# Altium footprint library Reflow3D1411sep.PcbLib: 657 footprints (part 14 of 42)
Each footprint in its own frame and in the unit in brackets; x right, y up, seen from the top. Pads: shape width x height; smd on the part's side, far side on the other; paste and mask are expansions set on the pad; w line width, h text height; cw(c..) or ccw(c..) is an arc to the next point about the centre after c.
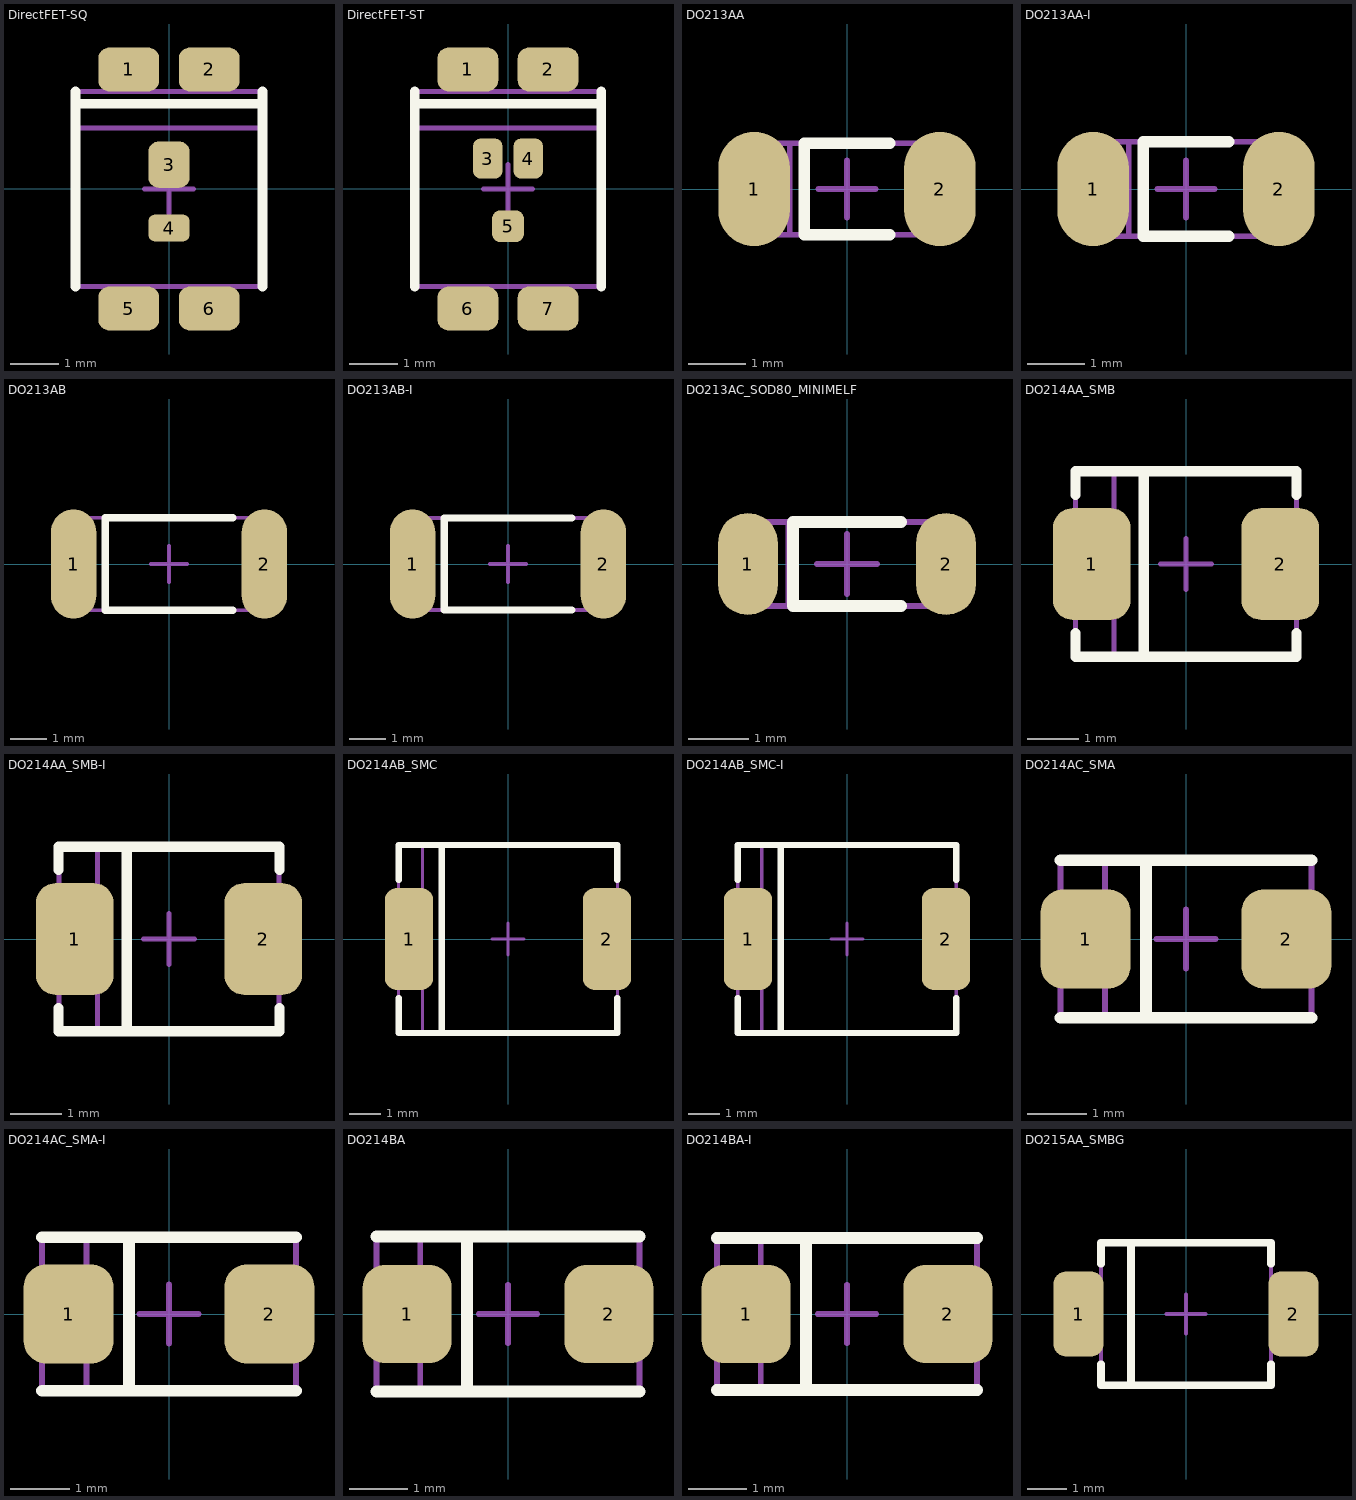
[diagram p13: the footprints below, top view; thin cyan lines are the x and y axes]

## DirectFET-SQ [mm] "www.irf.com, SQ-Outline.pdf, an-1035.pdf; www.infineon.com, MG-WDSON-2-SQ-Package_Overview.pdf"
height 0.65
pads (6):
  rrect50% 1.25x0.9 smd paste-25.4 mask+0: 1(-0.825,2.45) 2(0.825,2.45) 5(-0.825,-2.45) 6(0.825,-2.45)
  rrect50% 0.85x0.95 smd paste-25.4 mask+0: 3(0,0.5)
  rrect50% 0.85x0.55 smd paste-25.4 mask+0: 4(0,-0.8)
Top Overlay:
  lines w0.2: -1.915,-2 -1.915,2 ; -1.915,1.75 1.915,1.75 ; 1.915,-2 1.915,2
Top Paste:
  region: -0.375,0.9 -0.375,0.1 0.375,0.1 0.375,0.9
  region: -1.45,-2.1 -1.45,-2.8 -0.25,-2.8 -0.25,-2.1
  region: 0.25,-2.1 0.25,-2.8 1.45,-2.8 1.45,-2.1
  region: 0.25,2.8 0.25,2.1 1.45,2.1 1.45,2.8
  region: -1.45,2.8 -1.45,2.1 -0.25,2.1 -0.25,2.8
  region: -0.375,-0.575 -0.375,-1.025 0.375,-1.025 0.375,-0.575
Mechanical 13:
  lines w0.1: -1.915,1.25 1.915,1.25 ; -1.915,-2 -1.915,2 1.915,2 1.915,-2 -1.915,-2
Mechanical 15:
  lines w0.1: -0.5,0 0.5,0 ; 0,-0.5 0,0.5
3D body: height 0.7, standoff 0, extent -1.975,-2.075 1.975,2.075

## DirectFET-ST [mm] "www.irf.com, ST-Outline.pdf, an-1035.pdf; www.infineon.com, MG-WDSON-2-ST-Package_Overview.pdf"
height 0.65
pads (7):
  rrect50% 1.25x0.9 smd paste-25.4 mask+0: 1(-0.825,2.455) 2(0.825,2.455) 6(-0.825,-2.455) 7(0.825,-2.455)
  rrect50% 0.6x0.82 smd paste-25.4 mask+0: 3(-0.415,0.625) 4(0.415,0.625)
  rrect50% 0.65x0.65 smd paste-25.4 mask+0: 5(0,-0.765)
Top Overlay:
  lines w0.2: -1.915,-2 -1.915,2 ; -1.915,1.75 1.915,1.75 ; 1.915,-2 1.915,2
Top Paste:
  region: 0.165,0.99 0.165,0.24 0.665,0.24 0.665,0.99
  region: -1.45,-2.105 -1.45,-2.805 -0.25,-2.805 -0.25,-2.105
  region: 0.25,-2.105 0.25,-2.805 1.45,-2.805 1.45,-2.105
  region: 0.25,2.805 0.25,2.105 1.45,2.105 1.45,2.805
  region: -1.45,2.805 -1.45,2.105 -0.25,2.105 -0.25,2.805
  region: -0.3,-0.46 -0.3,-1.01 0.3,-1.01 0.3,-0.46
  region: -0.665,0.99 -0.665,0.24 -0.165,0.24 -0.165,0.99
Mechanical 13:
  lines w0.1: -1.915,1.25 1.915,1.25 ; -1.915,-2 -1.915,2 1.915,2 1.915,-2 -1.915,-2
Mechanical 15:
  lines w0.1: -0.5,0 0.5,0 ; 0,-0.5 0,0.5
3D body: height 0.7, standoff 0, extent -1.975,-2.075 1.975,2.075

## DO213AA [mm] "www.vishay.com, egl34.pdf"
height 1.6
pads (2):
  oval 1.25x2 smd mask+0.075: 1(-1.625,0) 2(1.625,0)
Top Overlay:
  lines w0.2: 0.75,-0.8 -0.75,-0.8 -0.75,0.8 0.75,0.8
Mechanical 13:
  lines w0.1: -1,-0.8 -1,0.8 ; -1.75,-0.8 -1.75,0.8 1.75,0.8 1.75,-0.8 -1.75,-0.8
Mechanical 15:
  lines w0.1: -0.5,0 0.5,0 ; 0,-0.5 0,0.5
3D body: height 1.68, standoff 0, extent -1.84,-0.84 1.84,0.84

## DO213AA-I [mm] "www.vishay.com, egl34.pdf; www.jedec.org, Do-213d.pdf"
height 1.65
pads (2):
  oval 1.25x2 smd mask+0.075: 1(-1.625,0) 2(1.625,0)
Top Overlay:
  lines w0.2: 0.75,-0.825 -0.75,-0.825 -0.75,0.825 0.75,0.825
Mechanical 13:
  lines w0.1: -1,-0.825 -1,0.825 ; -1.75,-0.825 1.75,-0.825 1.75,0.825 -1.75,0.825 -1.75,-0.825
Mechanical 15:
  lines w0.1: -0.5,0 0.5,0 ; 0,-0.5 0,0.5
3D body: height 1.7, standoff 0, extent -1.85,-0.85 1.85,0.85

## DO213AB [mm] "www.vishay.com, 85781.pdf"
height 2.54
pads (2):
  oval 1.25x3 smd mask+0.075: 1(-2.625,0) 2(2.625,0)
Top Overlay:
  lines w0.2: 1.75,-1.27 -1.75,-1.27 -1.75,1.27 1.75,1.27
Mechanical 13:
  lines w0.1: -1.725,-1.27 -1.725,1.27 ; -2.475,-1.27 -2.475,1.27 2.475,1.27 2.475,-1.27 -2.475,-1.27
Mechanical 15:
  lines w0.1: -0.5,0 0.5,0 ; 0,-0.5 0,0.5
3D body: height 2.67, standoff 0, extent -2.6,-1.335 2.6,1.335

## DO213AB-I [mm] "www.vishay.com, 85781.pdf; www.jedec.org, Do-213d.pdf"
height 2.53
pads (2):
  oval 1.25x3 smd mask+0.075: 1(-2.625,0) 2(2.625,0)
Top Overlay:
  lines w0.2: 1.75,-1.265 -1.75,-1.265 -1.75,1.265 1.75,1.265
Mechanical 13:
  lines w0.1: -1.725,-1.27 -1.725,1.27 ; -2.5,-1.265 2.5,-1.265 2.5,1.265 -2.5,1.265 -2.5,-1.265
Mechanical 15:
  lines w0.1: -0.5,0 0.5,0 ; 0,-0.5 0,0.5
3D body: height 2.66, standoff 0, extent -2.6,-1.33 2.6,1.33

## DO213AC_SOD80_MINIMELF [mm] "www.nxp.com, FOOTPRINT-SOD80C.pdf; www.fairchildsemi.com, SOD80A.pdf; www.jedec.org, Do-213d.pdf"
height 1.4
pads (2):
  oval 1x1.7 smd mask+0.075: 1(-1.65,0) 2(1.65,0)
Top Overlay:
  lines w0.2: 0.9,-0.7 -0.9,-0.7 -0.9,0.7 0.9,0.7
Mechanical 13:
  lines w0.1: -0.975,-0.7 -0.975,0.7 ; -1.725,-0.7 -1.725,0.7 1.725,0.7 1.725,-0.7 -1.725,-0.7
Mechanical 15:
  lines w0.1: -0.5,0 0.5,0 ; 0,-0.5 0,0.5
3D body: height 1.5, standoff 0, extent -1.8,-0.75 1.8,0.75

## DO214AA_SMB [mm] "www.vishay.com, b340lb.pdf"
height 2.29
pads (2):
  rrect50% 1.52x2.18 smd mask+0.075: 1(-1.84,0) 2(1.84,0)
Top Overlay:
  lines w0.2: -2.16,-1.35 -2.16,-1.81 2.16,-1.81 2.16,-1.35 ; -2.16,1.35 -2.16,1.81 2.16,1.81 2.16,1.35 ; -0.825,-1.81 -0.825,1.81
Mechanical 13:
  lines w0.1: -1.41,-1.81 -1.41,1.81 ; -2.16,-1.81 2.16,-1.81 2.16,1.81 -2.16,1.81 -2.16,-1.81
Mechanical 15:
  lines w0.1: -0.5,0 0.5,0 ; 0,-0.5 0,0.5
3D body: height 2.44, standoff 0, extent -2.285,-1.97 2.285,1.97

## DO214AA_SMB-I [mm] "www.vishay.com, b340lb.pdf; www.jedec.org, DO-214D.PDF"
height 2.3
pads (2):
  rrect50% 1.52x2.18 smd mask+0.075: 1(-1.84,0) 2(1.84,0)
Top Overlay:
  lines w0.2: -2.16,-1.35 -2.16,-1.8 2.16,-1.8 2.16,-1.35 ; -2.16,1.35 -2.16,1.8 2.16,1.8 2.16,1.35 ; -0.825,-1.8 -0.825,1.8
Mechanical 13:
  lines w0.1: -1.4,-1.8 -1.4,1.8 ; -2.15,-1.8 -2.15,1.8 2.15,1.8 2.15,-1.8 -2.15,-1.8
Mechanical 15:
  lines w0.1: -0.5,0 0.5,0 ; 0,-0.5 0,0.5
3D body: height 2.65, standoff 0, extent -2.3,-1.975 2.3,1.975

## DO214AB_SMC [mm] "www.vishay.com, rs3a.pdf"
height 2.34
pads (2):
  rrect50% 1.52x3.2 smd mask+0.075: 1(-3.105,0) 2(3.105,0)
Top Overlay:
  lines w0.2: -3.43,-1.85 -3.43,-2.95 3.43,-2.95 3.43,-1.85 ; -3.43,1.85 -3.43,2.95 3.43,2.95 3.43,1.85 ; -2.075,-2.95 -2.075,2.95
Mechanical 13:
  lines w0.1: -2.68,-2.95 -2.68,2.95 ; -3.43,-2.95 -3.43,2.95 3.43,2.95 3.43,-2.95 -3.43,-2.95
Mechanical 15:
  lines w0.1: -0.5,0 0.5,0 ; 0,-0.5 0,0.5
3D body: height 2.62, standoff 0, extent -3.555,-3.11 3.555,3.11

## DO214AB_SMC-I [mm] "www.vishay.com, rs3a.pdf; www.jedec.org, DO-214D.PDF"
height 2.3
pads (2):
  rrect50% 1.52x3.2 smd mask+0.075: 1(-3.105,0) 2(3.105,0)
Top Overlay:
  lines w0.2: -3.425,-1.85 -3.425,-2.95 3.425,-2.95 3.425,-1.85 ; -3.425,1.85 -3.425,2.95 3.425,2.95 3.425,1.85 ; -2.075,-2.95 -2.075,2.95
Mechanical 13:
  lines w0.1: -2.675,-2.95 -2.675,2.95 ; -3.425,-2.95 -3.425,2.95 3.425,2.95 3.425,-2.95 -3.425,-2.95
Mechanical 15:
  lines w0.1: -0.5,0 0.5,0 ; 0,-0.5 0,0.5
3D body: height 2.65, standoff 0, extent -3.575,-3.125 3.575,3.125

## DO214AC_SMA [mm] "www.vishay.com, as1m.pdf"
height 2.14
pads (2):
  rrect50% 1.52x1.68 smd mask+0.075: 1(-1.7,0) 2(1.7,0)
Top Overlay:
  lines w0.2: -2.125,-1.335 2.125,-1.335 ; -2.125,1.335 2.125,1.335 ; -0.675,-1.335 -0.675,1.335
Mechanical 13:
  lines w0.1: -1.375,-1.335 -1.375,1.335 ; -2.125,-1.335 -2.125,1.335 2.125,1.335 2.125,-1.335 -2.125,-1.335
Mechanical 15:
  lines w0.1: -0.5,0 0.5,0 ; 0,-0.5 0,0.5
3D body: height 2.29, standoff 0, extent -2.25,-1.395 2.25,1.395

## DO214AC_SMA-I [mm] "www.vishay.com, as1m.pdf; www.jedec.org, DO-214D.PDF"
height 2.4
pads (2):
  rrect50% 1.52x1.68 smd mask+0.075: 1(-1.7,0) 2(1.7,0)
Top Overlay:
  lines w0.2: -2.15,-1.3 2.15,-1.3 ; -2.15,1.3 2.15,1.3 ; -0.675,-1.3 -0.675,1.3
Mechanical 13:
  lines w0.1: -1.4,-1.3 -1.4,1.3 ; -2.15,-1.3 2.15,-1.3 2.15,1.3 -2.15,1.3 -2.15,-1.3
Mechanical 15:
  lines w0.1: -0.5,0 0.5,0 ; 0,-0.5 0,0.5
3D body: height 2.9, standoff 0, extent -2.3,-1.475 2.3,1.475

## DO214BA [mm] "www.vishay.com, gf1.pdf"
height 2.77
pads (2):
  rrect50% 1.52x1.68 smd mask+0.075: 1(-1.725,0) 2(1.725,0)
Top Overlay:
  lines w0.2: -2.25,-1.325 2.25,-1.325 ; -2.25,1.325 2.25,1.325 ; -0.7,-1.325 -0.7,1.325
Mechanical 13:
  lines w0.1: -1.5,-1.325 -1.5,1.325 ; -2.25,-1.325 -2.25,1.325 2.25,1.325 2.25,-1.325 -2.25,-1.325
Mechanical 15:
  lines w0.1: -0.5,0 0.5,0 ; 0,-0.5 0,0.5
3D body: height 3, standoff 0, extent -2.375,-1.45 2.375,1.45

## DO214BA-I [mm] "www.vishay.com, gf1.pdf; www.jedec.org, DO-214D.PDF"
height 2.95
pads (2):
  rrect50% 1.52x1.68 smd mask+0.075: 1(-1.725,0) 2(1.725,0)
Top Overlay:
  lines w0.2: -2.225,-1.3 2.225,-1.3 ; -2.225,1.3 2.225,1.3 ; -0.7,-1.3 -0.7,1.3
Mechanical 13:
  lines w0.1: -1.475,-1.3 -1.475,1.3 ; -2.225,-1.3 2.225,-1.3 2.225,1.3 -2.225,1.3 -2.225,-1.3
Mechanical 15:
  lines w0.1: -0.5,0 0.5,0 ; 0,-0.5 0,0.5
3D body: height 3.5, standoff 0, extent -2.4,-1.65 2.4,1.65

## DO215AA_SMBG [mm] "www.vishay.com, 88456.pdf"
height 2.28
pads (2):
  rrect50% 1.27x2.16 smd mask+0.075: 1(-2.73,0) 2(2.73,0)
Top Overlay:
  lines w0.2: -2.16,-1.275 -2.16,-1.81 2.16,-1.81 2.16,-1.275 ; -2.16,1.275 -2.16,1.81 2.16,1.81 2.16,1.275 ; -1.4,-1.81 -1.4,1.81
Mechanical 13:
  lines w0.1: -1.41,-1.81 -1.41,1.81 ; -2.16,-1.81 2.16,-1.81 2.16,1.81 -2.16,1.81 -2.16,-1.81
Mechanical 15:
  lines w0.1: -0.5,0 0.5,0 ; 0,-0.5 0,0.5
3D body: height 2.61, standoff 0, extent -2.285,-1.97 2.285,1.97